# Altium footprint library CM3Board.PcbLib: 127 footprints (part 4 of 8)
Each footprint in its own frame and in the unit in brackets; x right, y up, seen from the top. Pads: shape width x height; smd on the part's side, far side on the other; paste and mask are expansions set on the pad; w line width, h text height; cw(c..) or ccw(c..) is an arc to the next point about the centre after c.
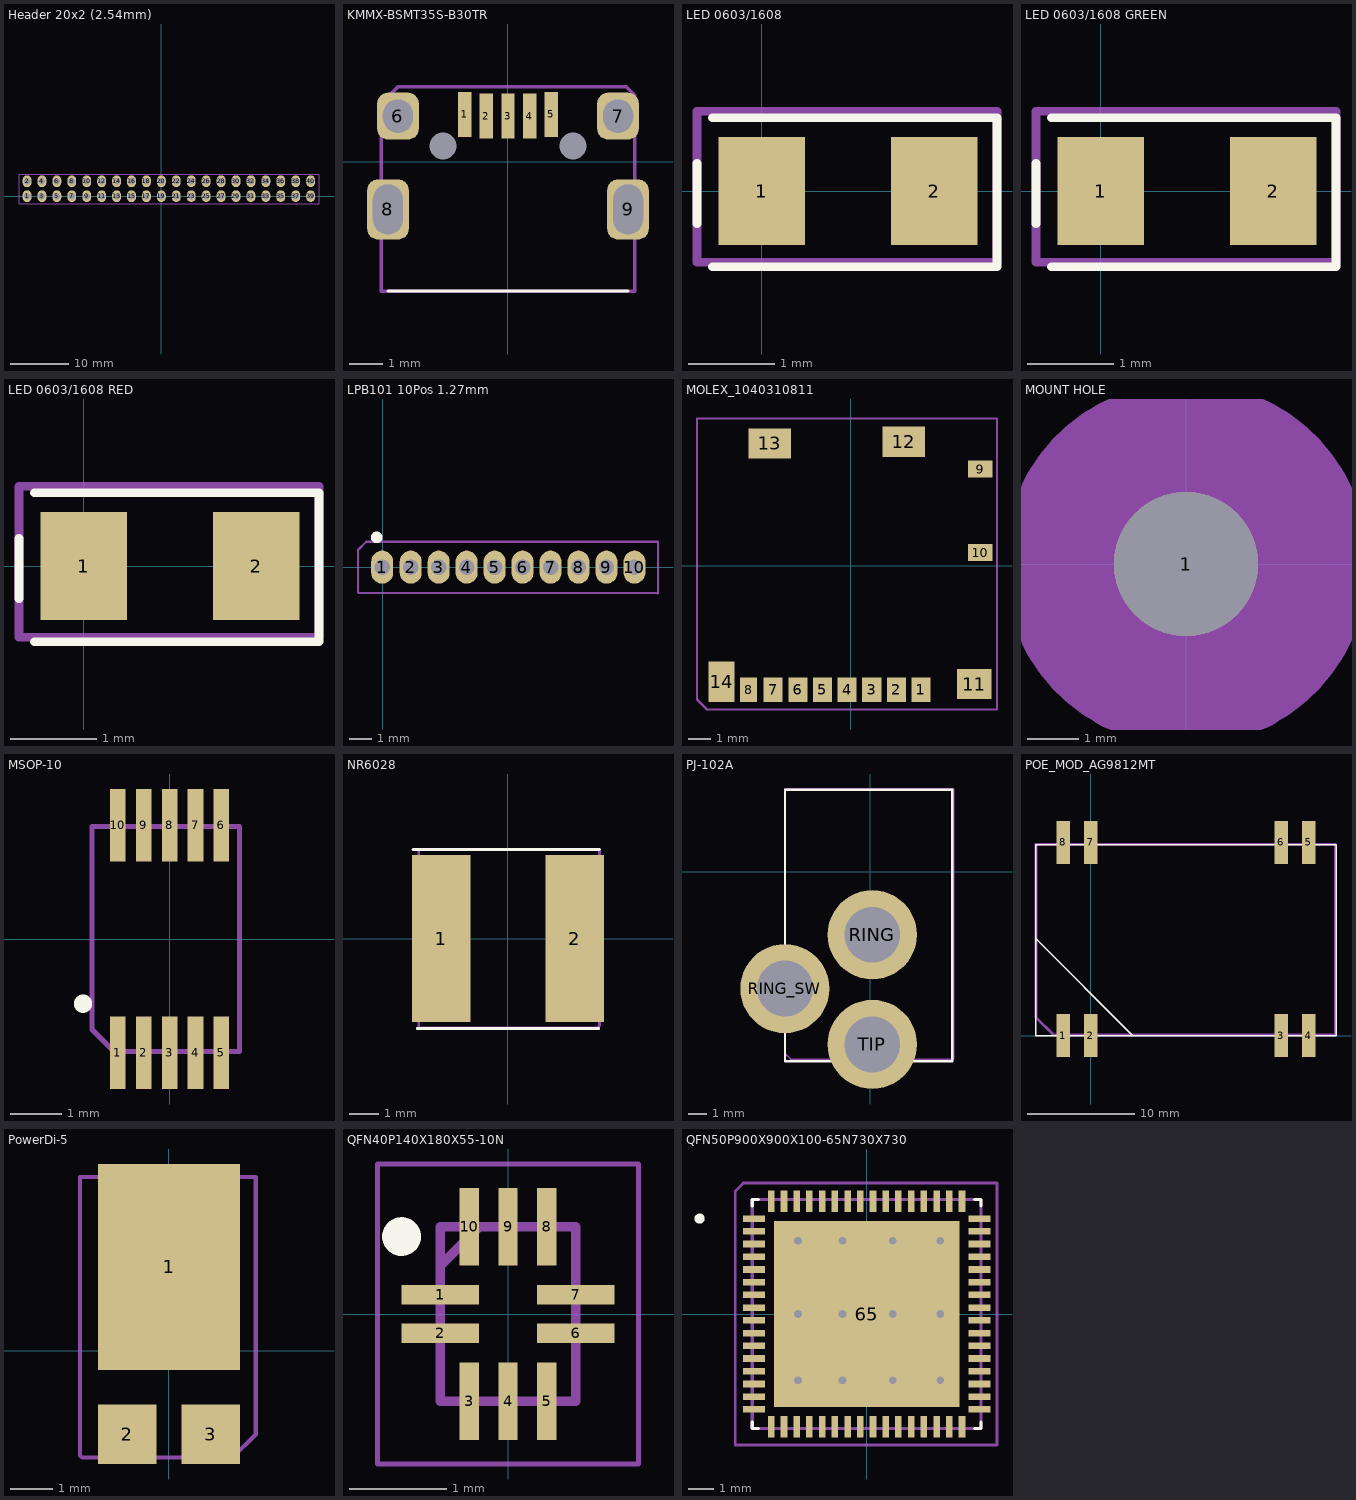
[diagram p3: the footprints below, top view; thin cyan lines are the x and y axes]

## Header 20x2 (2.54mm) [mm]
pads (40):
  oval 1.5x2 hole 1.1: 1(-22.86,0) 2(-22.86,2.54) 3(-20.32,0) 4(-20.32,2.54) 5(-17.78,0) 6(-17.78,2.54) 7(-15.24,0) 8(-15.24,2.54) 9(-12.7,0) 10(-12.7,2.54) 11(-10.16,0) 12(-10.16,2.54) 13(-7.62,0) 14(-7.62,2.54) 15(-5.08,0) 16(-5.08,2.54) 17(-2.54,0) 18(-2.54,2.54) 19(0,0) 20(0,2.54) 21(2.54,0.01) 22(2.54,2.55) 23(5.08,0.01) 24(5.08,2.55) 25(7.62,0.01) 26(7.62,2.55) 27(10.16,0.01) 28(10.16,2.55) 29(12.7,0.01) 30(12.7,2.55) 31(15.24,0.01) 32(15.24,2.55) 33(17.78,0.01) 34(17.78,2.55) 35(20.32,0.01) 36(20.32,2.55) 37(22.86,0.01) 38(22.86,2.55) 39(25.4,0.01) 40(25.4,2.55)
Mechanical 29:
  lines w0.1: -24.225,-1.25 26.825,-1.25 26.825,3.7 -24.225,3.7 -24.225,-1.25 ; -24.225,-1.25 -24.225,-1.25
  text ".Designator" at -14.66,1.275 h1
  text ".Designator" at 10.75,1.275 h1
3D body "header2x10x2.54.stp": height 10.67, standoff -2.79, extent -24.16,-1.265 1.24,3.815
3D body "header2x10x2.54.stp": height 10.67, standoff -2.79, extent 1.275,-1.255 26.675,3.825

## KMMX-BSMT35S-B30TR [mm]
pads (11):
  rect 0.4x1.35 smd: 1(-1.3,1.425) 2(-0.65,1.375) 3(0,1.375) 4(0.65,1.375) 5(1.3,1.425)
  rrect50% 1.25x1.4 hole 0.9 slot 1 at 90 deg: 6(-3.3,1.375) 7(3.3,1.375)
  rrect50% 1.25x1.8 hole 0.9 slot 1.5 at 90 deg: 8(-3.6,-1.425) 9(3.6,-1.425)
  rect 0x0 hole 0.8: ""(-1.95,0.475) ""(1.95,0.475)
Top Overlay:
  lines w0.1: -3.6,-3.875 3.6,-3.875
Mechanical 29:
  lines w0.1: -3.8,-3.875 -3.8,1.75 -3.3,2.25 3.55,2.25 3.8,2 3.8,-3.875 -3.8,-3.875
  text ".Designator" at -1.9,-1.6 h1
3D body "--KMMX-BSMT35S-BTR_A.STEP": height 2.68, standoff -0.9, extent -3.75,-3.875 3.75,1.525

## LED 0603/1608 [mm]
pads (2):
  rect 1x1.25 smd: 1(0,0) 2(2,0)
Top Overlay:
  lines w0.1: -0.75,-0.375 -0.75,0.325 ; -0.575,-0.875 2.725,-0.875 2.725,0.85 -0.575,0.85
Mechanical 29:
  lines w0.1: -0.75,-0.825 2.725,-0.825 2.725,0.925 -0.75,0.925 -0.75,-0.825
  text ".Designator" at -0.55,-0.5 h1
3D body "CHIPLED-0805.step": height 0.9, standoff -0.01, extent -0.125,-0.725 1.975,0.625

## LED 0603/1608 GREEN [mm]
pads (2):
  rect 1x1.25 smd: 1(0,0) 2(2,0)
Top Overlay:
  lines w0.1: -0.75,-0.375 -0.75,0.325 ; -0.575,-0.875 2.725,-0.875 2.725,0.85 -0.575,0.85
Mechanical 29:
  lines w0.1: -0.75,-0.825 -0.75,0.925 2.725,0.925 2.725,-0.825 -0.75,-0.825
  text ".Designator" at -0.55,-0.5 h1
3D body "CHIPLED-0805_GREEN.step": height 0.7, standoff -0.63, extent -0.15,-0.7 2.15,0.7

## LED 0603/1608 RED [mm]
pads (2):
  rect 1x1.25 smd: 1(0,0) 2(2,0)
Top Overlay:
  lines w0.1: -0.75,-0.375 -0.75,0.325 ; -0.575,-0.875 2.725,-0.875 2.725,0.85 -0.575,0.85
Mechanical 29:
  lines w0.1: -0.75,-0.825 2.725,-0.825 2.725,0.925 -0.75,0.925 -0.75,-0.825
  text ".Designator" at -0.55,-0.5 h1
3D body "CHIPLED-0805.step": height 0.9, standoff -0.01, extent -0.125,-0.725 1.975,0.625

## LPB101 10Pos 1.27mm [mm]
pads (10):
  oval 1x1.5 hole 0.7: 1(-0.025,0) 2(1.27,0) 3(2.54,0) 4(3.81,0) 5(5.08,0) 6(6.35,0) 7(7.62,0) 8(8.89,0) 9(10.16,0) 10(11.43,0)
Top Overlay:
  circle w0.254: c-0.275,1.35 r0.135
Mechanical 29:
  lines w0.1: -1.125,-1.125 -1.125,0.775 -0.75,1.15 0.4,1.15 12.5,1.15 12.5,-1.2 12.475,-1.175 -1.075,-1.175 -1.125,-1.125
  text ".Designator" at 0,-0.525 h1.52
3D body "female_header10pin.stp": height 3.5, standoff -2.3, extent -0.825,-0.85 12.275,0.95

## MOLEX_1040310811 [mm] "Molex MicroSD"
pads (14):
  rect 0.85x1.1 smd: 1(3.13,-5.537) 2(2.03,-5.537) 3(0.93,-5.537) 4(-0.17,-5.537) 5(-1.27,-5.537) 6(-2.37,-5.537) 7(-3.47,-5.537)
  rect 0.75x1.1 smd: 8(-4.57,-5.537)
  rect 1.1x0.75 smd: 9(5.78,4.313) 10(5.78,0.587)
  rect 1.55x1.35 smd: 11(5.505,-5.288)
  rect 1.9x1.35 smd: 12(2.355,5.537) 13(-3.62,5.463)
  rect 1.17x1.8 smd: 14(-5.78,-5.188)
Mechanical 29:
  lines w0.1: -6.875,-5.975 -6.425,-6.425 6.525,-6.425 6.525,6.575 -6.875,6.575 -6.875,-5.975
  text ".Designator" at -4.65,0.1 h1
3D body "1040310811.stp": height 1.44, standoff -0.01, extent -5.895,-5.812 6.055,5.588

## MOUNT HOLE [mm]
pads (1):
  round 2.8 hole 2.8 unplated: 1(0,0)
Mechanical 8:
  circle w0.457: c0,0 r0.635
  lines w2.286: -1.778,0 ccw(c0,0) 0,-1.778 ; 0,1.778 cw(c0,0) 1.778,0
Mechanical 22:
  circle w0.203: c0,0 r1.5
  circle w0.152: c0,0 r2.921
Mechanical 30:
  circle w2.032: c0,0 r2.54
Mechanical 31:
  circle w2.032: c0,0 r2.54

## MSOP-10 [mm]
pads (10):
  rect 0.3x1.4 smd: 1(-1,-2.2) 2(-0.5,-2.2) 3(0,-2.2) 4(0.5,-2.2) 5(1,-2.2) 6(1,2.2) 7(0.5,2.2) 8(0,2.2) 9(-0.5,2.2) 10(-1,2.2)
Top Overlay:
  circle w0.254: c-1.675,-1.25 r0.05
Mechanical 29:
  lines w0.1: -1.5,-1.75 -1.075,-2.175 1.35,-2.175 1.35,2.175 -1.5,2.175 -1.5,-1.75
  text ".Designator" at 0.15,-1.775 h1
3D body "msop-10.STEP": height 1.15, standoff 0, extent -1.5,-2.55 1.5,2.35

## NR6028 [mm] "TAIYO YUDEN"
pads (2):
  rect 2x5.7 smd: 1(-2.275,0) 2(2.275,0)
Top Overlay:
  lines w0.1: -3.25,3.05 3.125,3.05 ; -3.1,-3.075 3.1,-3.075
Mechanical 29:
  lines w0.1: -3.05,-3.025 -3.025,-3.05 3.05,-3.05 3.125,-2.975 3.125,3.05 -3.05,3.05 -3.05,-3.025
  text ".Designator" at -0.975,-0.7 h1
3D body "NR6028T150M.step": height 2.91, standoff 0.05, extent -2.975,-3 3.025,3

## PCBComponent_1 [mm]

## PJ-102A [mm] "PJ-102A"
pads (3):
  round 4.8 / inner round 1.524 / far side round 4.8 hole 3: RING(0.1,-3.39) RING_SW(-4.6,-6.29) TIP(0.1,-9.29)
Top Overlay:
  lines w0.127: -4.6,-10.2 4.4,-10.2 4.4,4.4 -4.6,4.4 -4.6,-10.2
Mechanical 29:
  lines w0.1: -4.6,-9.775 -4.6,4.45 4.475,4.45 4.475,-10.075 4.45,-10.1 -4.275,-10.1 -4.6,-9.775
  text ".Designator" at -0.65,-4.2 h1
3D body "DC-10A.step": height 11.5, standoff -3, extent -4.725,-10 4.575,4.4

## POE_MOD_AG9812MT [mm] "POE_MOD_AG9812MT"
pads (8):
  rect 1.25x4 smd: 1(-2.54,0) 2(0,0) 3(17.78,0) 4(20.32,0) 5(20.32,18) 6(17.78,18) 7(0,18) 8(-2.54,18)
Top Overlay:
  lines w0.127: -5.08,0 3.937,0 22.86,0 22.86,17.78 -5.08,17.78 -5.08,9.017 -5.08,0
  lines w0.15: -5.08,9.017 3.937,0
Mechanical 29:
  lines w0.254: -5.075,1.7 -3.425,0.05 22.825,0.05 22.8,0.075 22.8,17.775 22.75,17.825 -5.075,17.825 -5.075,1.7
  text ".Designator" at 5.25,10 h1

## PowerDi-5 [mm]
pads (3):
  rect 3.36x4.86 smd: 1(0,1.976)
  rect 1.39x1.4 smd: 2(-0.985,-1.976) 3(0.985,-1.976)
Mechanical 29:
  lines w0.1: -2.1,-2.474 -2.05,-2.524 1.5,-2.524 2.05,-1.974 2.05,4.026 2.05,4.101 -2.1,4.101 -2.1,-2.474
  text ".Designator" at -1.35,0.101 h1.52
3D body "PowerDI-5.STEP": height 1.17, standoff 0.02, extent -2.043,-2.549 2.007,4.051

## QFN40P140X180X55-10N [mm]
pads (10):
  rect 0.8x0.2 smd: 1(-0.7,0.2) 2(-0.7,-0.2) 6(0.7,-0.2) 7(0.7,0.2)
  rect 0.2x0.8 smd: 3(-0.4,-0.9) 4(0,-0.9) 5(0.4,-0.9) 8(0.4,0.9) 9(0,0.9) 10(-0.4,0.9)
Top Overlay:
  circle w0.2: c-1.1,0.8 r0.1
Mechanical 15:
  lines w0.05: -1.35,-1.55 -1.35,1.55 1.35,1.55 1.35,-1.55 -1.35,-1.55
Mechanical 29:
  lines w0.1: -0.7,0.5 -0.3,0.9 ; -0.7,-0.9 -0.7,0.9 0.7,0.9 0.7,-0.9 -0.7,-0.9
  text ".Designator" at -0.41,1.59 h0.7
3D body "FSUSB42UMX.stp": height 0.55, standoff 0, extent -0.75,-0.95 0.75,0.95

## QFN50P900X900X100-65N730X730 [mm]
pads (65):
  rect 0.86x0.26 smd: 1(-4.435,3.75) 2(-4.435,3.25) 3(-4.435,2.75) 4(-4.435,2.25) 5(-4.435,1.75) 6(-4.435,1.25) 7(-4.435,0.75) 8(-4.435,0.25) 9(-4.435,-0.25) 10(-4.435,-0.75) 11(-4.435,-1.25) 12(-4.435,-1.75) 13(-4.435,-2.25) 14(-4.435,-2.75) 15(-4.435,-3.25) 16(-4.435,-3.75) 33(4.435,-3.75) 34(4.435,-3.25) 35(4.435,-2.75) 36(4.435,-2.25) 37(4.435,-1.75) 38(4.435,-1.25) 39(4.435,-0.75) 40(4.435,-0.25) 41(4.435,0.25) 42(4.435,0.75) 43(4.435,1.25) 44(4.435,1.75) 45(4.435,2.25) 46(4.435,2.75) 47(4.435,3.25) 48(4.435,3.75)
  rect 0.26x0.86 smd: 17(-3.75,-4.435) 18(-3.25,-4.435) 19(-2.75,-4.435) 20(-2.25,-4.435) 21(-1.75,-4.435) 22(-1.25,-4.435) 23(-0.75,-4.435) 24(-0.25,-4.435) 25(0.25,-4.435) 26(0.75,-4.435) 27(1.25,-4.435) 28(1.75,-4.435) 29(2.25,-4.435) 30(2.75,-4.435) 31(3.25,-4.435) 32(3.75,-4.435) 49(3.75,4.435) 50(3.25,4.435) 51(2.75,4.435) 52(2.25,4.435) 53(1.75,4.435) 54(1.25,4.435) 55(0.75,4.435) 56(0.25,4.435) 57(-0.25,4.435) 58(-0.75,4.435) 59(-1.25,4.435) 60(-1.75,4.435) 61(-2.25,4.435) 62(-2.75,4.435) 63(-3.25,4.435) 64(-3.75,4.435)
  rect 7.3x7.3 smd: 65(0,0)
via -2.7,2.875 diameter 1.27 hole 0.3
via -0.95,2.875 diameter 1.27 hole 0.3
via 1.025,2.875 diameter 1.27 hole 0.3
via 2.9,2.875 diameter 1.27 hole 0.3
via 2.9,0 diameter 1.27 hole 0.3
via 1.025,0 diameter 1.27 hole 0.3
via -2.7,-2.6 diameter 1.27 hole 0.3
via -0.95,-2.6 diameter 1.27 hole 0.3
via 1.025,-2.6 diameter 1.27 hole 0.3
via 2.9,-2.6 diameter 1.27 hole 0.3
via -0.95,0 diameter 1.27 hole 0.3
via -2.7,0 diameter 1.27 hole 0.3
Top Overlay:
  circle w0.2: c-6.57,3.75 r0.1
  lines w0.127: -4.5,-4.25 -4.5,-4.5 -4.25,-4.5 ; -4.5,4.25 -4.5,4.5 -4.25,4.5 ; 4.25,-4.5 4.5,-4.5 4.5,-4.25 ; 4.25,4.5 4.5,4.5 4.5,4.25
Top Paste:
  region: 1.565,-1.56 3.12,-1.56 3.12,-3.129 1.565,-3.129
  region: -0.782,-1.56 0.78,-1.56 0.78,-3.128 -0.782,-3.128
  region: -3.126,-1.56 -1.56,-1.56 -1.56,-3.126 -3.126,-3.126
  region: -3.125,3.12 -1.56,3.12 -1.56,1.563 -3.125,1.563
  region: -0.783,3.12 0.78,3.12 0.78,1.566 -0.783,1.566
  region: 1.566,3.12 3.12,3.12 3.12,1.566 1.566,1.566
  region: 1.565,0.78 3.12,0.78 3.12,-0.782 1.565,-0.782
  region: -3.124,0.78 -1.56,0.78 -1.56,-0.781 -3.124,-0.781
  region: -0.783,0.78 0.78,0.78 0.78,-0.783 -0.783,-0.783
Mechanical 4:
  lines w0.127: -4.5,-4.5 -4.5,4.5 ; -4.5,-4.5 4.5,-4.5 ; -4.5,-4.5 -4.5,4.5 ; -4.5,-4.5 4.5,-4.5 ; -4.5,4.5 4.5,4.5 ; -4.5,4.5 4.5,4.5 ; 4.5,-4.5 4.5,4.5 ; 4.5,-4.5 4.5,4.5
Mechanical 29:
  lines w0.1: -5.175,-5.15 -5.175,4.825 -4.85,5.15 -4.825,5.15 5.125,5.15 5.125,-5.15 -5.175,-5.15
  text ".Designator" at -1.5,-0.15 h1
3D body "LAN9514-JZX.stp": height 1, standoff 0, extent -4.55,-4.575 4.55,4.525